# Altium footprint library DIP Connector.PcbLib: 69 footprints (part 1 of 5)
Each footprint in its own frame and in the unit in brackets; x right, y up, seen from the top. Pads: shape width x height; smd on the part's side, far side on the other; paste and mask are expansions set on the pad; w line width, h text height; cw(c..) or ccw(c..) is an arc to the next point about the centre after c.
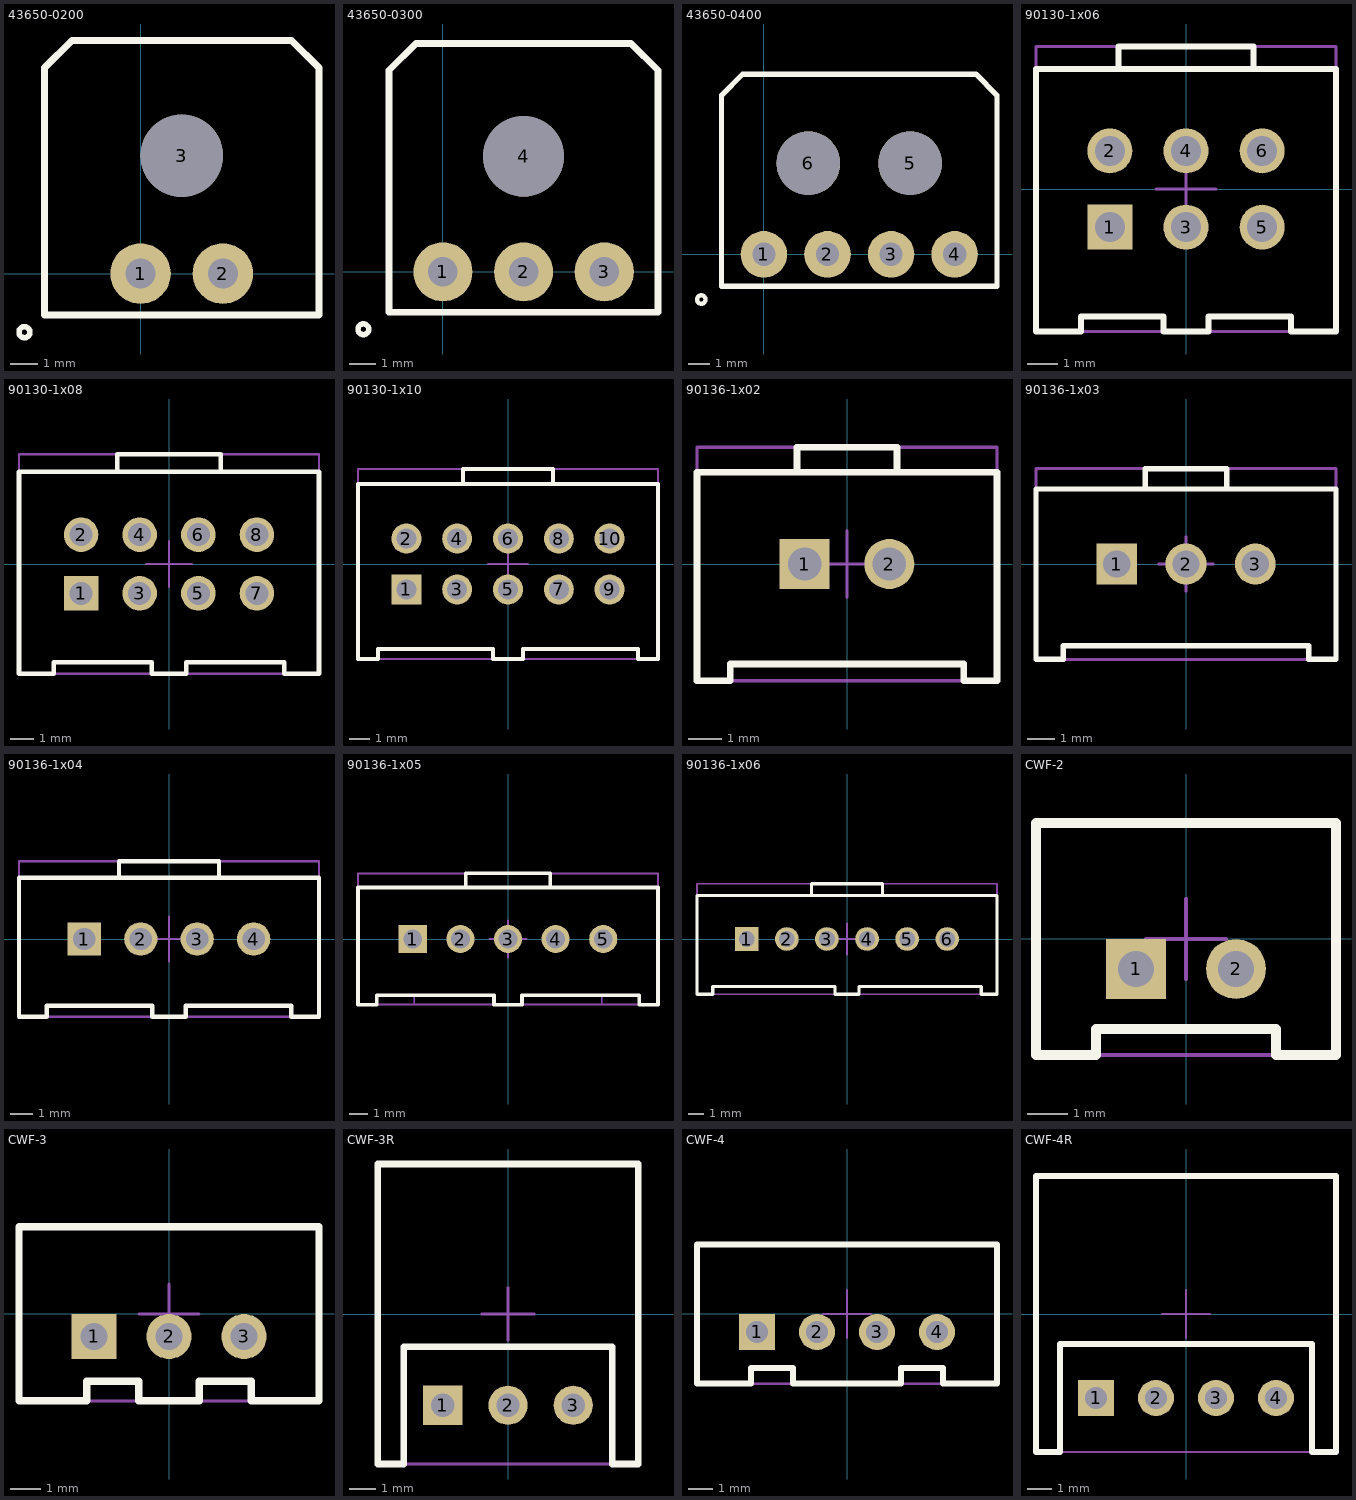
[diagram p0: the footprints below, top view; thin cyan lines are the x and y axes]

## 43650-0200 [mm]
pads (3):
  round 2.2 hole 1.1: 1(0,0) 2(3,0)
  round 3 hole 3: 3(1.5,4.3)
Top Overlay:
  circle w0.2: c-4.229,-2.134 r0.2
  lines w0.254: -3.5,-1.5 6.5,-1.5 6.5,7.5 5.5,8.5 -2.5,8.5 -3.5,7.5 -3.5,-1.5
3D body "436500200.stp": height 5.64, standoff -3.27, extent -3.325,-1 6.325,8.9

## 43650-0300 [mm]
pads (4):
  round 2.2 hole 1.1: 1(0,0) 2(3,0) 3(6,0)
  round 3 hole 3: 4(3,4.3)
Top Overlay:
  circle w0.2: c-2.959,-2.134 r0.2
  lines w0.254: -2,-1.5 -2,7.5 -1,8.5 7,8.5 8,7.5 8,-1.5 -2,-1.5

## 43650-0400 [mm]
pads (6):
  round 2.2 hole 1.1: 1(0,0) 2(3,0) 3(6,0) 4(9,0)
  round 3 hole 3: 5(6.9,4.3) 6(2.1,4.3)
Top Overlay:
  circle w0.2: c-2.959,-2.134 r0.2
  lines w0.254: -2,-1.5 11,-1.5 11,7.5 10,8.5 -1,8.5 -2,7.5 -2,-1.5

## 90130-1x06 [mm]
height 10.9
pads (6):
  rect 1.5x1.5 hole 1: 1(-2.54,-1.27)
  round 1.5 hole 1: 2(-2.54,1.27) 3(0,-1.27) 4(0,1.27) 5(2.54,-1.27) 6(2.54,1.27)
Top Overlay:
  lines w0.2: -2.25,4 -2.25,4.75 2.25,4.75 2.25,4 ; -5,-4.75 -5,4 5,4 5,-4.75 3.5,-4.75 3.5,-4.25 0.75,-4.25 0.75,-4.75 -0.75,-4.75 -0.75,-4.25 -3.5,-4.25 -3.5,-4.75 -5,-4.75
Mechanical 13:
  lines w0.1: -2.25,4 -2.25,4.75 2.25,4.75 2.25,4 ; -5,-4.75 -3.5,-4.75 -3.5,-4.25 -0.75,-4.25 -0.75,-4.75 0.75,-4.75 0.75,-4.25 3.5,-4.25 3.5,-4.75 5,-4.75 5,4 -5,4 -5,-4.75
Mechanical 15:
  lines w0.1: -1,0 1,0 ; 0,-1 0,1 ; -5,-4.75 5,-4.75 5,4.75 -5,4.75 -5,-4.75
3D body "901301106.stp": height 10.95, standoff -2.85, extent -4.98,-4.875 4.98,4.875

## 90130-1x08 [mm]
height 10.9
pads (8):
  rect 1.5x1.5 hole 1: 1(-3.81,-1.27)
  round 1.5 hole 1: 2(-3.81,1.27) 3(-1.27,-1.27) 4(-1.27,1.27) 5(1.27,-1.27) 6(1.27,1.27) 7(3.81,-1.27) 8(3.81,1.27)
Top Overlay:
  lines w0.2: -2.25,4 -2.25,4.75 2.25,4.75 2.25,4 ; -6.5,-4.75 -6.5,4 6.5,4 6.5,-4.75 5,-4.75 5,-4.25 0.75,-4.25 0.75,-4.75 -0.75,-4.75 -0.75,-4.25 -5,-4.25 -5,-4.75 -6.5,-4.75
Mechanical 13:
  lines w0.1: -2.25,4 -2.25,4.75 2.25,4.75 2.25,4 ; -6.5,-4.75 -6.5,4 6.5,4 6.5,-4.75 5,-4.75 5,-4.25 0.75,-4.25 0.75,-4.75 -0.75,-4.75 -0.75,-4.25 -5,-4.25 -5,-4.75 -6.5,-4.75
Mechanical 15:
  lines w0.1: -1,0 1,0 ; 0,-1 0,1 ; -6.5,-4.75 -6.5,4.75 6.5,4.75 6.5,-4.75 -6.5,-4.75
3D body "901301108.stp": height 10.95, standoff -2.85, extent -6.25,-4.875 6.25,4.875

## 90130-1x10 [mm]
height 10.9
pads (10):
  rect 1.5x1.5 hole 1: 1(-5.08,-1.27)
  round 1.5 hole 1: 2(-5.08,1.27) 3(-2.54,-1.27) 4(-2.54,1.27) 5(0,-1.27) 6(0,1.27) 7(2.54,-1.27) 8(2.54,1.27) 9(5.08,-1.27) 10(5.08,1.27)
Top Overlay:
  lines w0.2: -2.25,4 -2.25,4.75 2.25,4.75 2.25,4 ; -7.5,-4.75 -6.5,-4.75 -6.5,-4.25 -0.75,-4.25 -0.75,-4.75 0.75,-4.75 0.75,-4.25 6.5,-4.25 6.5,-4.75 7.5,-4.75 7.5,4 -7.5,4 -7.5,-4.75
Mechanical 13:
  lines w0.1: -2.25,4 -2.25,4.75 2.25,4.75 2.25,4 ; -7.5,-4.75 -7.5,4 7.5,4 7.5,-4.75 6.5,-4.75 6.5,-4.25 0.75,-4.25 0.75,-4.75 -0.75,-4.75 -0.75,-4.25 -6.5,-4.25 -6.5,-4.75 -7.5,-4.75
Mechanical 15:
  lines w0.1: -1,0 1,0 ; 0,-1 0,1 ; -7.5,-4.75 -7.5,4.75 7.5,4.75 7.5,-4.75 -7.5,-4.75
3D body "901301110.stp": height 10.95, standoff -2.85, extent -7.52,-4.875 7.52,4.875

## 90136-1x02 [mm]
height 10.9
pads (2):
  rect 1.5x1.5 hole 1: 1(-1.27,0)
  round 1.5 hole 1: 2(1.27,0)
Top Overlay:
  lines w0.2: -1.5,2.75 -1.5,3.5 1.5,3.5 1.5,2.75 ; -4.5,-3.5 -4.5,2.75 4.5,2.75 4.5,-3.5 3.5,-3.5 3.5,-3 -3.5,-3 -3.5,-3.5 -4.5,-3.5
Mechanical 13:
  lines w0.1: -1.5,2.75 -1.5,3.5 1.5,3.5 1.5,2.75 ; -4.5,-3.5 -3.5,-3.5 -3.5,-3 3.5,-3 3.5,-3.5 4.5,-3.5 4.5,2.75 -4.5,2.75 -4.5,-3.5
Mechanical 15:
  lines w0.1: -1,0 1,0 ; 0,-1 0,1 ; -4.5,-3.5 -4.5,3.5 4.5,3.5 4.5,-3.5 -4.5,-3.5
3D body "901361102.stp": height 10.95, standoff -2.85, extent -4.215,-3.605 4.215,3.605

## 90136-1x03 [mm]
height 10.9
pads (3):
  rect 1.5x1.5 hole 1: 1(-2.54,0)
  round 1.5 hole 1: 2(0,0) 3(2.54,0)
Top Overlay:
  lines w0.2: -1.5,2.75 -1.5,3.5 1.5,3.5 1.5,2.75 ; -5.5,-3.5 -5.5,2.75 5.5,2.75 5.5,-3.5 4.5,-3.5 4.5,-3 -4.5,-3 -4.5,-3.5 -5.5,-3.5
Mechanical 13:
  lines w0.1: -1.5,2.75 -1.5,3.5 1.5,3.5 1.5,2.75 ; -5.5,-3.5 -4.5,-3.5 -4.5,-3 4.5,-3 4.5,-3.5 5.5,-3.5 5.5,2.75 -5.5,2.75 -5.5,-3.5
Mechanical 15:
  lines w0.1: -1,0 1,0 ; 0,-1 0,1 ; -5.5,-3.5 -5.5,3.5 5.5,3.5 5.5,-3.5 -5.5,-3.5
3D body "901361103.stp": height 10.95, standoff -2.85, extent -5.485,-3.605 5.485,3.605

## 90136-1x04 [mm]
height 10.9
pads (4):
  rect 1.5x1.5 hole 1: 1(-3.81,0)
  round 1.5 hole 1: 2(-1.27,0) 3(1.27,0) 4(3.81,0)
Top Overlay:
  lines w0.2: -2.25,2.75 -2.25,3.5 2.25,3.5 2.25,2.75 ; -6.75,-3.5 -5.5,-3.5 -5.5,-3 -0.75,-3 -0.75,-3.5 0.75,-3.5 0.75,-3 5.5,-3 5.5,-3.5 6.75,-3.5 6.75,2.75 -6.75,2.75 -6.75,-3.5
Mechanical 13:
  lines w0.1: -2.25,2.75 -2.25,3.5 2.25,3.5 2.25,2.75 ; -6.75,-3.5 -6.75,2.75 6.75,2.75 6.75,-3.5 5.5,-3.5 5.5,-3 0.75,-3 0.75,-3.5 -0.75,-3.5 -0.75,-3 -5.5,-3 -5.5,-3.5 -6.75,-3.5
Mechanical 15:
  lines w0.1: -1,0 1,0 ; 0,-1 0,1 ; -6.75,-3.5 -6.75,3.5 6.75,3.5 6.75,-3.5 -6.75,-3.5
3D body "901361104.stp": height 10.95, standoff -2.85, extent -6.755,-3.605 6.755,3.605

## 90136-1x05 [mm]
height 10.9
pads (5):
  rect 1.5x1.5 hole 1: 1(-5.08,0)
  round 1.5 hole 1: 2(-2.54,0) 3(0,0) 4(2.54,0) 5(5.08,0)
Top Overlay:
  lines w0.2: -2.25,2.75 -2.25,3.5 2.25,3.5 2.25,2.75 ; -8,-3.5 -8,2.75 8,2.75 8,-3.5 7,-3.5 7,-3 0.75,-3 0.75,-3.5 -0.75,-3.5 -0.75,-3 -7,-3 -7,-3.5 -8,-3.5
Mechanical 13:
  lines w0.1: -2.25,2.75 -2.25,3.5 2.25,3.5 2.25,2.75 ; -8,-3.5 -5,-3.5 -5,-3 -0.75,-3 -0.75,-3.5 0.75,-3.5 0.75,-3 5,-3 5,-3.5 8,-3.5 8,2.75 -8,2.75 -8,-3.5
Mechanical 15:
  lines w0.1: -1,0 1,0 ; 0,-1 0,1 ; -8,-3.5 8,-3.5 8,3.5 -8,3.5 -8,-3.5
3D body "901361105.stp": height 10.95, standoff -2.85, extent -8.025,-3.605 8.025,3.605

## 90136-1x06 [mm]
height 10.9
pads (6):
  rect 1.5x1.5 hole 1: 1(-6.35,0)
  round 1.5 hole 1: 2(-3.81,0) 3(-1.27,0) 4(1.27,0) 5(3.81,0) 6(6.35,0)
Top Overlay:
  lines w0.2: -2.25,2.75 -2.25,3.5 2.25,3.5 2.25,2.75 ; -9.5,-3.5 -8.5,-3.5 -8.5,-3 -0.75,-3 -0.75,-3.5 0.75,-3.5 0.75,-3 8.5,-3 8.5,-3.5 9.5,-3.5 9.5,2.75 -9.5,2.75 -9.5,-3.5
Mechanical 13:
  lines w0.1: -2.25,2.75 -2.25,3.5 2.25,3.5 2.25,2.75 ; -9.5,-3.5 -9.5,2.75 9.5,2.75 9.5,-3.5 8.5,-3.5 8.5,-3 0.75,-3 0.75,-3.5 -0.75,-3.5 -0.75,-3 -8.5,-3 -8.5,-3.5 -9.5,-3.5
Mechanical 15:
  lines w0.1: -1,0 1,0 ; 0,-1 0,1 ; -9.5,-3.5 -9.5,3.5 9.5,3.5 9.5,-3.5 -9.5,-3.5
3D body "901361106.stp": height 10.95, standoff -2.85, extent -9.295,-3.605 9.295,3.605

## CWF-2 [mm]
height 7.7
pads (2):
  rect 1.5x1.5 hole 0.9: 1(-1.25,-0.75)
  round 1.5 hole 0.9: 2(1.25,-0.75)
Top Overlay:
  lines w0.25: -3.75,-2.9 -2.25,-2.9 -2.25,-2.25 2.25,-2.25 2.25,-2.9 3.75,-2.9 3.75,2.9 -3.75,2.9 -3.75,-2.9
Mechanical 13:
  lines w0.1: -3.75,-2.9 -3.75,2.9 3.75,2.9 3.75,-2.9 2.25,-2.9 2.25,-2.25 -2.25,-2.25 -2.25,-2.9 -3.75,-2.9
Mechanical 15:
  lines w0.1: -1,0 1,0 ; 0,-1 0,1 ; -3.75,-2.9 -3.75,2.9 3.75,2.9 3.75,-2.9 -3.75,-2.9
3D body "User Library-CWF-2.step": height 7.2, standoff -3.3, extent -3.75,-2.85 3.75,2.9

## CWF-3 [mm]
height 7.7
pads (3):
  rect 1.5x1.5 hole 0.9: 1(-2.5,-0.75)
  round 1.5 hole 0.9: 2(0,-0.75) 3(2.5,-0.75)
Top Overlay:
  lines w0.25: -5,-2.9 -2.75,-2.9 -2.75,-2.25 -1,-2.25 -1,-2.9 1,-2.9 1,-2.25 2.75,-2.25 2.75,-2.9 5,-2.9 5,2.9 -5,2.9 -5,-2.9
Mechanical 13:
  lines w0.1: -5,-2.9 -5,2.9 5,2.9 5,-2.9 2.75,-2.9 2.75,-2.25 1,-2.25 1,-2.9 -1,-2.9 -1,-2.25 -2.75,-2.25 -2.75,-2.9 -5,-2.9
Mechanical 15:
  lines w0.1: -1,0 1,0 ; 0,-1 0,1 ; -5,-2.9 5,-2.9 5,2.9 -5,2.9 -5,-2.9
3D body "User Library-CWF-3.step": height 7.2, standoff -3.3, extent -5,-2.85 5,2.9

## CWF-3R [mm]
height 7.7
pads (3):
  rect 1.5x1.5 hole 0.9: 1(-2.5,-3.5)
  round 1.5 hole 0.9: 2(0,-3.5) 3(2.5,-3.5)
Top Overlay:
  lines w0.25: -5,-5.75 -4,-5.75 -4,-1.25 4,-1.25 4,-5.75 5,-5.75 5,5.75 -5,5.75 -5,-5.75
Mechanical 13:
  lines w0.1: -5,-5.75 -5,5.75 5,5.75 5,-5.75 4,-5.75 4,-1.25 -4,-1.25 -4,-5.75 -5,-5.75
Mechanical 15:
  lines w0.1: -1,0 1,0 ; 0,-1 0,1 ; -5,-5.75 5,-5.75 5,5.75 -5,5.75 -5,-5.75

## CWF-4 [mm]
height 7.7
pads (4):
  rect 1.5x1.5 hole 0.9: 1(-3.75,-0.75)
  round 1.5 hole 0.9: 2(-1.25,-0.75) 3(1.25,-0.75) 4(3.75,-0.75)
Top Overlay:
  lines w0.25: -6.25,-2.9 -4,-2.9 -4,-2.25 -2.25,-2.25 -2.25,-2.9 2.25,-2.9 2.25,-2.25 4,-2.25 4,-2.9 6.25,-2.9 6.25,2.9 -6.25,2.9 -6.25,-2.9
Mechanical 13:
  lines w0.1: -6.25,-2.9 -6.25,2.9 6.25,2.9 6.25,-2.9 4,-2.9 4,-2.25 2.25,-2.25 2.25,-2.9 -2.25,-2.9 -2.25,-2.25 -4,-2.25 -4,-2.9 -6.25,-2.9
Mechanical 15:
  lines w0.1: -1,0 1,0 ; 0,-1 0,1 ; -6.25,-2.9 -6.25,2.9 6.25,2.9 6.25,-2.9 -6.25,-2.9
3D body "User Library-CWF-4.step": height 7.2, standoff -3.3, extent -6.2,-2.9 6.2,2.85

## CWF-4R [mm]
height 7.7
pads (4):
  rect 1.5x1.5 hole 0.9: 1(-3.75,-3.5)
  round 1.5 hole 0.9: 2(-1.25,-3.5) 3(1.25,-3.5) 4(3.75,-3.5)
Top Overlay:
  lines w0.25: -6.25,-5.75 -5.25,-5.75 -5.25,-1.25 5.25,-1.25 5.25,-5.75 6.25,-5.75 6.25,5.75 -6.25,5.75 -6.25,-5.75
Mechanical 13:
  lines w0.1: -6.25,-5.75 -6.25,5.75 6.25,5.75 6.25,-5.75 5.25,-5.75 5.25,-1.25 -5.25,-1.25 -5.25,-5.75 -6.25,-5.75
Mechanical 15:
  lines w0.1: -1,0 1,0 ; 0,-1 0,1 ; -6.25,-5.75 6.25,-5.75 6.25,5.75 -6.25,5.75 -6.25,-5.75
3D body "User Library-DS1069-4 MR TypeA.step": height 5.85, standoff -3.3, extent -6.2,-5.75 6.2,5.75